# Altium integrated library MOTHER_BOARD_LS1021_v1.0.IntLib: 147 symbols
Pins are listed as number, name and electrical type; pins without a type are passive.

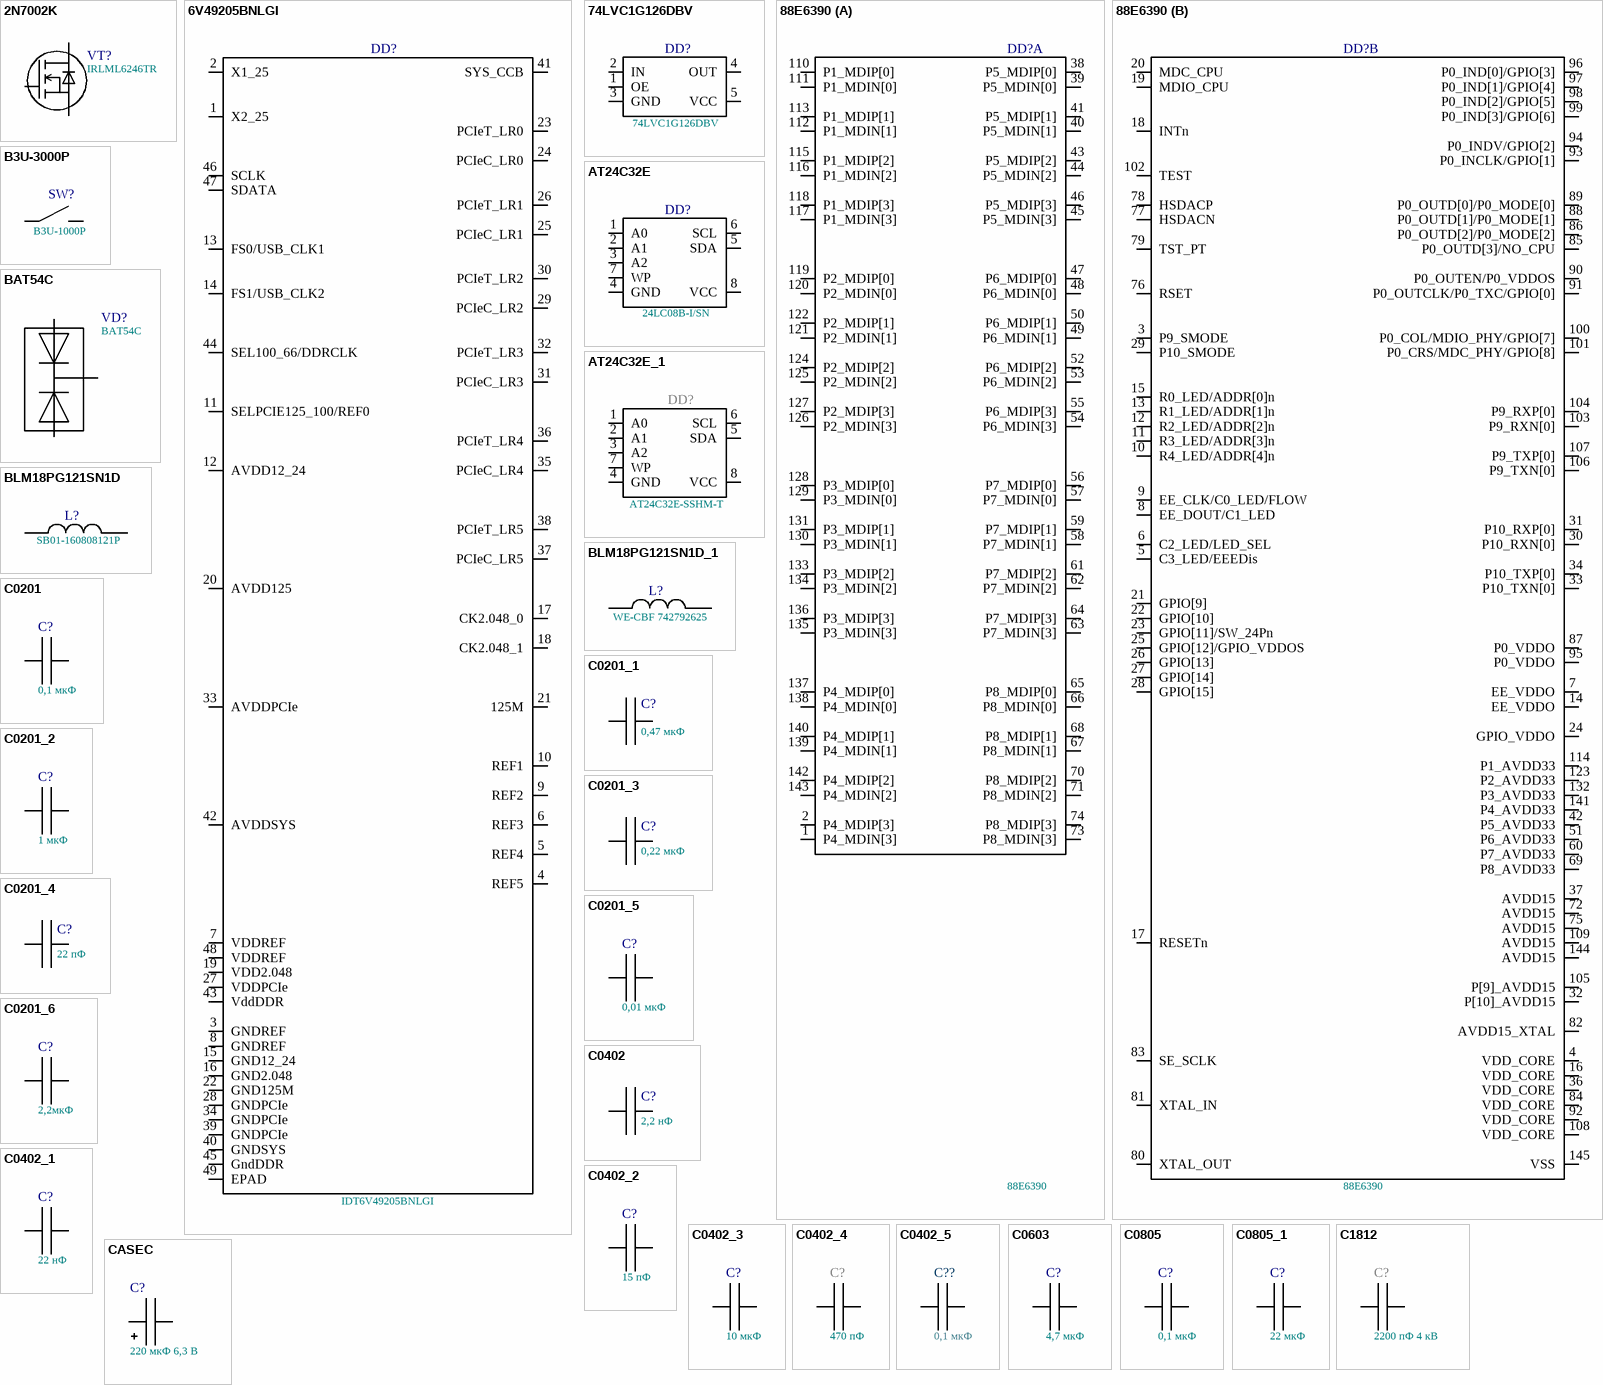
[diagram p0: symbols 2N7002K to CASEC]

## 2N7002K
designator VT?, comment IRLML6246TR
Транзистор MOSFET N-Channel IRLML6246TR SOT-23; VALUE: IRLML6246TRPbF
footprint SOT-23
pins: 1 G, 2 S, 3 D

## 6V49205BNLGI
designator DD?, comment IDT6V49205BNLGI
Микросхема IDT6V49205BNLGI; Manufactory: IDT; Function: Генератор частот для QorIQ® Layerscape Processors
footprint QFN48_7x7
pins: 1 X2_25, 2 X1_25, 3 GNDREF, 4 REF5, 5 REF4, 6 REF3, 7 VDDREF, 8 GNDREF, 9 REF2, 10 REF1, 11 SELPCIE125_100/REF0, 12 AVDD12_24, 13 FS0/USB_CLK1, 14 FS1/USB_CLK2, 15 GND12_24, 16 GND2.048, 17 CK2.048_0, 18 CK2.048_1, 19 VDD2.048, 20 AVDD125, 21 125M, 22 GND125M, 23 PCIeT_LR0, 24 PCIeC_LR0, 25 PCIeC_LR1, 26 PCIeT_LR1, 27 VDDPCIe, 28 GNDPCIe, 29 PCIeC_LR2, 30 PCIeT_LR2, 31 PCIeC_LR3, 32 PCIeT_LR3, 33 AVDDPCIe, 34 GNDPCIe, 35 PCIeC_LR4, 36 PCIeT_LR4, 37 PCIeC_LR5, 38 PCIeT_LR5, 39 GNDPCIe, 40 GNDSYS, 41 SYS_CCB, 42 AVDDSYS, 43 VddDDR, 44 SEL100_66/DDRCLK, 45 GndDDR, 46 SCLK, 47 SDATA, 48 VDDREF, 49 EPAD

## 74LVC1G126DBV
designator DD?
Микросхема 74LVC1G126DBV; Manufactory: Texas Instruments; Function: Single non-inverting buffer/bus driver with a 3-state output
footprint SOT-23(DBV5)
pins: 1 OE, 2 IN, 3 GND (power), 4 OUT, 5 VCC (power)

## 88E6390
designator DD?
Микросхема 88E6390-xxTLA2I000; Manufactory: Marvell Technology; Function: 11-Port AVB GE Switch, 8 GE PHYs + 1 RGMII/MII/RMII + 2 2.5G Serdes/SGMII
footprint TQFP-144 (EPAD)
part A pins: 1 P4_MDIN[3], 2 P4_MDIP[3], 38 P5_MDIP[0], 39 P5_MDIN[0], 40 P5_MDIN[1], 41 P5_MDIP[1], 43 P5_MDIP[2], 44 P5_MDIN[2], 45 P5_MDIN[3], 46 P5_MDIP[3], 47 P6_MDIP[0], 48 P6_MDIN[0], 49 P6_MDIN[1], 50 P6_MDIP[1], 52 P6_MDIP[2], 53 P6_MDIN[2], 54 P6_MDIN[3], 55 P6_MDIP[3], 56 P7_MDIP[0], 57 P7_MDIN[0], 58 P7_MDIN[1], 59 P7_MDIP[1], 61 P7_MDIP[2], 62 P7_MDIN[2], 63 P7_MDIN[3], 64 P7_MDIP[3], 65 P8_MDIP[0], 66 P8_MDIN[0], 67 P8_MDIN[1], 68 P8_MDIP[1], 70 P8_MDIP[2], 71 P8_MDIN[2], 73 P8_MDIN[3], 74 P8_MDIP[3], 110 P1_MDIP[0], 111 P1_MDIN[0], 112 P1_MDIN[1], 113 P1_MDIP[1], 115 P1_MDIP[2], 116 P1_MDIN[2], 117 P1_MDIN[3], 118 P1_MDIP[3], 119 P2_MDIP[0], 120 P2_MDIN[0], 121 P2_MDIN[1], 122 P2_MDIP[1], 124 P2_MDIP[2], 125 P2_MDIN[2], 126 P2_MDIN[3], 127 P2_MDIP[3], 128 P3_MDIP[0], 129 P3_MDIN[0], 130 P3_MDIN[1], 131 P3_MDIP[1], 133 P3_MDIP[2], 134 P3_MDIN[2], 135 P3_MDIN[3], 136 P3_MDIP[3], 137 P4_MDIP[0], 138 P4_MDIN[0], 139 P4_MDIN[1], 140 P4_MDIP[1], 142 P4_MDIP[2], 143 P4_MDIN[2]
part B pins: 3 P9_SMODE, 4 VDD_CORE, 5 C3_LED/EEEDis, 6 C2_LED/LED_SEL, 7 EE_VDDO, 8 EE_DOUT/C1_LED, 9 EE_CLK/C0_LED/FLOW, 10 R4_LED/ADDR[4]n, 11 R3_LED/ADDR[3]n, 12 R2_LED/ADDR[2]n, 13 R1_LED/ADDR[1]n, 14 EE_VDDO, 15 R0_LED/ADDR[0]n, 16 VDD_CORE, 17 RESETn, 18 INTn, 19 MDIO_CPU, 20 MDC_CPU, 21 GPIO[9], 22 GPIO[10], 23 GPIO[11]/SW_24Pn, 24 GPIO_VDDO, 25 GPIO[12]/GPIO_VDDOS, 26 GPIO[13], 27 GPIO[14], 28 GPIO[15], 29 P10_SMODE, 30 P10_RXN[0], 31 P10_RXP[0], 32 P[10]_AVDD15, 33 P10_TXN[0], 34 P10_TXP[0], 36 VDD_CORE, 37 AVDD15, 42 P5_AVDD33, 51 P6_AVDD33, 60 P7_AVDD33, 69 P8_AVDD33, 72 AVDD15, 75 AVDD15, 76 RSET, 77 HSDACN, 78 HSDACP, 79 TST_PT, 80 XTAL_OUT, 81 XTAL_IN, 82 AVDD15_XTAL, 83 SE_SCLK, 84 VDD_CORE, 85 P0_OUTD[3]/NO_CPU, 86 P0_OUTD[2]/P0_MODE[2], 87 P0_VDDO, 88 P0_OUTD[1]/P0_MODE[1], 89 P0_OUTD[0]/P0_MODE[0], 90 P0_OUTEN/P0_VDDOS, 91 P0_OUTCLK/P0_TXC/GPIO[0], 92 VDD_CORE, 93 P0_INCLK/GPIO[1], 94 P0_INDV/GPIO[2], 95 P0_VDDO, 96 P0_IND[0]/GPIO[3], 97 P0_IND[1]/GPIO[4], 98 P0_IND[2]/GPIO[5], 99 P0_IND[3]/GPIO[6], 100 P0_COL/MDIO_PHY/GPIO[7], 101 P0_CRS/MDC_PHY/GPIO[8], 102 TEST, 103 P9_RXN[0], 104 P9_RXP[0], 105 P[9]_AVDD15, 106 P9_TXN[0], 107 P9_TXP[0], 108 VDD_CORE, 109 AVDD15, 114 P1_AVDD33, 123 P2_AVDD33, 132 P3_AVDD33, 141 P4_AVDD33, 144 AVDD15, 145 VSS

## AT24C32E
designator DD?, comment 24LC08B-I/SN
Микросхема 24LC08B-I/SN; Manufactory: Microchip Technology; Function: 8K I2C™ Serial EEPROM
footprint SOIC8
pins: 1 A0, 2 A1, 3 A2, 4 GND, 5 SDA, 6 SCL, 7 WP, 8 VCC

## AT24C32E_1
designator DD?, comment AT24C32E-SSHM-T  (no BOM)
Микросхема AT24C32E-SSHM-T; Manufactory: Microchip Technology; Function: Память EEPROM I2C 32 Кбит
footprint SOIC8
pins: 1 A0, 2 A1, 3 A2, 4 GND, 5 SDA, 6 SCL, 7 WP, 8 VCC

## B3U-3000P
designator SW?, comment B3U-1000P
Кнопка тактовая B3U-1000P; Manufactory: Omron
pins: 1, 2

## BAT54C
designator VD?
Диодная сборка с общим катодом BAT54C SOT-23
footprint SOT-23
pins: 1, 2, 3

## BLM18PG121SN1D
designator L?, comment SB01-160808121P
Индуктивность SB01-160808121P; Manufactory: CHIKARA Electronics; Function: 120 Ohms @ 100MHz 1 Power Line Ferrite Bead 0603 (1608 Metric) 2,2 A
footprint L0603 (Ferrite bead)
pins: 1, 2

## BLM18PG121SN1D_1
designator L?, comment WE-CBF 742792625
Фильтр индуктивный WE-CBF 742792625 Wurth Elektronik; TYPE: BLM18PG121SN1D
footprint L0603 (Ferrite bead)
pins: 1, 2

## C0201
designator C?, comment 0,1 мкФ
Чип-конденсатор 0,1 мкФ 10 В 0201; TYPE: Чип-конденсатор 0201
footprint C0201
footprint C0201
pins: 1, 2

## C0201_1
designator C?, comment 0,47 мкФ
Чип-конденсатор 0,47 мкФ 10 В 0201; TYPE: Чип-конденсатор 0201
footprint C0201
pins: 1, 2

## C0201_2
designator C?, comment 1 мкФ
Чип-конденсатор 1 мкФ 10 В 0201; TYPE: Чип-конденсатор 0201
footprint C0201
pins: 1, 2

## C0201_3
designator C?, comment 0,22 мкФ
Чип-конденсатор 0,22 мкФ 6,3 В 0201; TYPE: Чип-конденсатор 0201
footprint C0201
pins: 1, 2

## C0201_4
designator C?, comment 22 пФ
Чип-конденсатор 22 пФ 25 В 0201; TYPE: Чип-конденсатор 0201
footprint C0201
pins: 1, 2

## C0201_5
designator C?, comment 0,01 мкФ
Чип-конденсатор 0,01 мкФ 10 В 0201; TYPE: Чип-конденсатор 0201
footprint C0201
pins: 1, 2

## C0201_6
designator C?, comment 2,2мкФ
Чип-конденсатор 2,2 мкФ 10 В 0201; TYPE: Чип-конденсатор 0201
footprint C0201
pins: 1, 2

## C0402
designator C?, comment 2,2 нФ
Чип-конденсатор 2200 пФ 50 В 0402; TYPE: Чип-конденсатор 0402
footprint C0402
pins: 1, 2

## C0402_1
designator C?, comment 22 нФ
Чип-конденсатор 22 нФ 50 В 0402; TYPE: Чип-конденсатор 0402
footprint C0402
pins: 1, 2

## C0402_2
designator C?, comment 15 пФ
Чип-конденсатор 15 пФ 50 В 0402; TYPE: Чип-конденсатор 0402
footprint C0402
pins: 1, 2

## C0402_3
designator C?, comment 10 мкФ
Чип-конденсатор 10 мкФ 6,3 В 0402; TYPE: Чип-конденсатор 0402
footprint C0402
pins: 1, 2

## C0402_4
designator C?, comment 470 пФ  (no BOM)
Чип-конденсатор 470 пФ ±20% 0402; TYPE: Чип-конденсатор 0402; VALUE: 470 пФ 0402
footprint C0402
pins: 1, 2

## C0402_5
designator C??, comment 0,1 мкФ
Чип-конденсатор 0,1 мкФ 16В/25В 0402; TYPE: Чип-конденсатор 0402
footprint C0402
pins: 1, 2

## C0603
designator C?, comment 4,7 мкФ
Чип-конденсатор 4,7 мкФ 10 В 0603; TYPE: Чип-конденсатор 0603
footprint C0603
pins: 1, 2

## C0805
designator C?, comment 0,1 мкФ
Чип-конденсатор 0,1 мкФ  100 В 0805; TYPE: Чип-конденсатор 0805
footprint C0805
pins: 1, 2

## C0805_1
designator C?, comment 22 мкФ
Чип-конденсатор 22 мкФ 25 В 0805; TYPE: Чип-конденсатор 0805
footprint C0805
pins: 1, 2

## C1812
designator C?, comment 2200 пФ 4 кВ  (no BOM)
Чип-конденсатор 2200 пФ 4 кВ 1812; TYPE: Чип-конденсатор 0402
footprint C1812
pins: 1, 2

## CASEC
designator C?, comment 220 мкФ 6,3 В
Конденсатор танталовый  220 мкФ ±20% 6,3 В Case C
footprint CaseC
pins: 1, 2

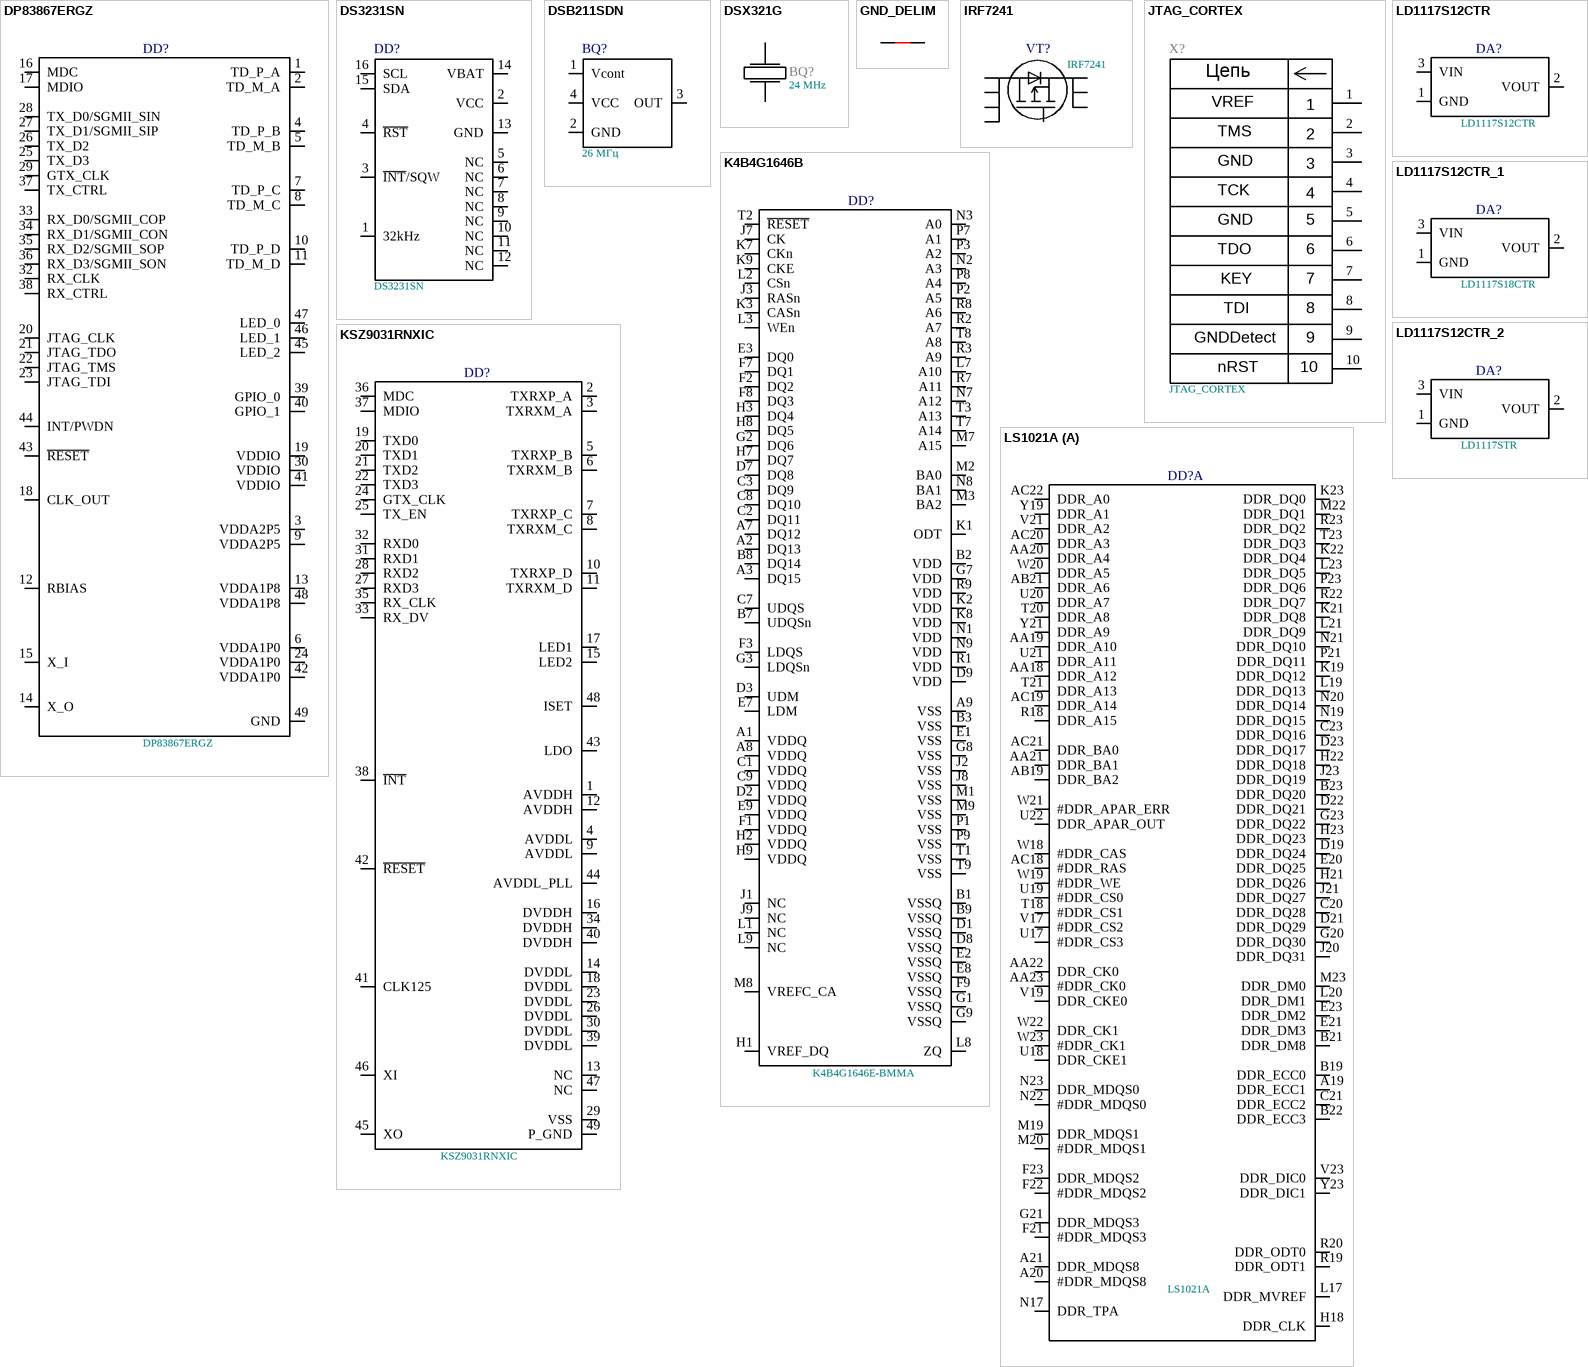
[diagram p1: symbols DP83867ERGZ to LS1021A]

## DP83867ERGZ
designator DD?
Микросхема DP83867ERGZ; Manufactory: Texas Instruments; Function: 10/100/1000 Ethernet Physical  Layer Transceiver
footprint QFN-48
pins: 1 TD_P_A, 2 TD_M_A, 3 VDDA2P5, 4 TD_P_B, 5 TD_M_B, 6 VDDA1P0, 7 TD_P_C, 8 TD_M_C, 9 VDDA2P5, 10 TD_P_D, 11 TD_M_D, 12 RBIAS, 13 VDDA1P8, 14 X_O, 15 X_I, 16 MDC, 17 MDIO, 18 CLK_OUT, 19 VDDIO, 20 JTAG_CLK, 21 JTAG_TDO, 22 JTAG_TMS, 23 JTAG_TDI, 24 VDDA1P0, 25 TX_D3, 26 TX_D2, 27 TX_D1/SGMII_SIP, 28 TX_D0/SGMII_SIN, 29 GTX_CLK, 30 VDDIO, 32 RX_CLK, 33 RX_D0/SGMII_COP, 34 RX_D1/SGMII_CON, 35 RX_D2/SGMII_SOP, 36 RX_D3/SGMII_SON, 37 TX_CTRL, 38 RX_CTRL, 39 GPIO_0, 40 GPIO_1, 41 VDDIO, 42 VDDA1P0, 43 ~{RESET}, 44 INT/PWDN, 45 LED_2, 46 LED_1, 47 LED_0, 48 VDDA1P8, 49 GND

## DS3231SN
designator DD?
Микросхема DS3231SN; Manufactory: Maxim Integrated; Function: Extremely Accurate I2C-Integrated RTC/TCXO/Crystal
footprint SOIC-16(WIDE) 0.6х2 P1.27
pins: 1 32kHz, 2 VCC, 3 ~{INT}/SQW, 4 ~{RST}, 5 NC, 6 NC, 7 NC, 8 NC, 9 NC, 10 NC, 11 NC, 12 NC, 13 GND, 14 VBAT, 15 SDA, 16 SCL

## DSB211SDN
designator BQ?, comment 26 МГц
Генератор кварцевый DSB211SDN 26 МГц +3,3 В
footprint DSB211SDN
pins: 1 Vcont, 2 GND, 3 OUT, 4 VCC

## DSX321G
designator BQ?, comment 24 MHz  (no BOM)
Резонатор кварцевый DSX321G 24 MHz
footprint DS321G
footprint DS321G
pins: 1, 3

## GND_DELIM
designator K?  (value not drawn)  (net tie, no BOM)
Точка соединения земель
footprint GND_DELIM
pins: 1, 2

## IRF7241
designator VT?
Транзистор MOSFET P-Channel IRF7241 SOIC-8
footprint SOIC8
pins: 1 S, 2 S, 3 S, 4 G, 5 D, 6 D, 7 D, 8 D

## JTAG_CORTEX
designator X?  (no BOM)
PLLD1.27-10s
footprint PLLD1.27-10s
pins: 1, 2, 3, 4, 5, 6, 7, 8, 9, 10
text: Цепь; VREF; TMS; GND; TCK; TDO; KEY; TDI; GNDDetect; nRST

## K4B4G1646B
designator DD?, comment K4B4G1646E-BMMA
Микросхема K4B4G1646E-BMMA; Manufactory: Samsung Semiconductor; Function: Память DDR3L SDRAM 4Gb (256x16)
footprint FBGA-96
pins: A1 VDDQ, A2 DQ13, A3 DQ15, A7 DQ12, A8 VDDQ, A9 VSS, B1 VSSQ, B2 VDD, B3 VSS, B7 UDQSn, B8 DQ14, B9 VSSQ, C1 VDDQ, C2 DQ11, C3 DQ9, C7 UDQS, C8 DQ10, C9 VDDQ, D1 VSSQ, D2 VDDQ, D3 UDM, D7 DQ8, D8 VSSQ, D9 VDD, E1 VSS, E2 VSSQ, E3 DQ0, E7 LDM, E8 VSSQ, E9 VDDQ, F1 VDDQ, F2 DQ2, F3 LDQS, F7 DQ1, F8 DQ3, F9 VSSQ, G1 VSSQ, G2 DQ6, G3 LDQSn, G7 VDD, G8 VSS, G9 VSSQ, H1 VREF_DQ, H2 VDDQ, H3 DQ4, H7 DQ7, H8 DQ5, H9 VDDQ, J1 NC, J2 VSS, J3 RASn, J7 CK, J8 VSS, J9 NC, K1 ODT, K2 VDD, K3 CASn, K7 CKn, K8 VDD, K9 CKE, L1 NC, L2 CSn, L3 WEn, L7 A10, L8 ZQ, L9 NC, M1 VSS, M2 BA0, M3 BA2, M7 A15, M8 VREFC_CA, M9 VSS, N1 VDD, N2 A3, N3 A0, N7 A12, N8 BA1, N9 VDD, P1 VSS, P2 A5, P3 A2, P7 A1, P8 A4, P9 VSS, R1 VDD, R2 A7, R3 A9, R7 A11, R8 A6, R9 VDD, T1 VSS, T2 ~{RESET}, T3 A13, T7 A14, T8 A8, T9 VSS

## KSZ9031RNXIC
designator DD?
Микросхема KSZ9031RNXIC; Manufactory: Microchip Technology; Function: Gigabit Ethernet Transceiver with GMII/MII Support with Low Power Features
footprint QFN48 (5.1 Epad) (KSZ9031RNXCC)
pins: 1 AVDDH, 2 TXRXP_A, 3 TXRXM_A, 4 AVDDL, 5 TXRXP_B, 6 TXRXM_B, 7 TXRXP_C, 8 TXRXM_C, 9 AVDDL, 10 TXRXP_D, 11 TXRXM_D, 12 AVDDH, 13 NC, 14 DVDDL, 15 LED2, 16 DVDDH, 17 LED1, 18 DVDDL, 19 TXD0, 20 TXD1, 21 TXD2, 22 TXD3, 23 DVDDL, 24 GTX_CLK, 25 TX_EN, 26 DVDDL, 27 RXD3, 28 RXD2, 29 VSS, 30 DVDDL, 31 RXD1, 32 RXD0, 33 RX_DV, 34 DVDDH, 35 RX_CLK, 36 MDC, 37 MDIO, 38 ~{INT}, 39 DVDDL, 40 DVDDH, 41 CLK125, 42 ~{RESET}, 43 LDO, 44 AVDDL_PLL, 45 XO, 46 XI, 47 NC, 48 ISET, 49 P_GND

## LD1117S12CTR
designator DA?
Микросхема LD1117S12CTR; Manufactory: STMicroelectronics; Function: Low Drop Fixed +1,2V Voltage Regulator
footprint SOT-223
pins: 1 GND, 2 VOUT, 3 VIN

## LD1117S12CTR_1
designator DA?, comment LD1117S18CTR
Микросхема LD1117S18CTR; Manufactory: STMicroelectronics; Function: Low Drop Fixed +1,8V Voltage Regulator
footprint SOT-223
pins: 1 GND, 2 VOUT, 3 VIN

## LD1117S12CTR_2
designator DA?, comment LD1117STR
Микросхема LD1117STR; Manufactory: STMicroelectronics; Function: Low Drop adjustable voltage regulator
footprint SOT-223
pins: 1 GND, 2 VOUT, 3 VIN

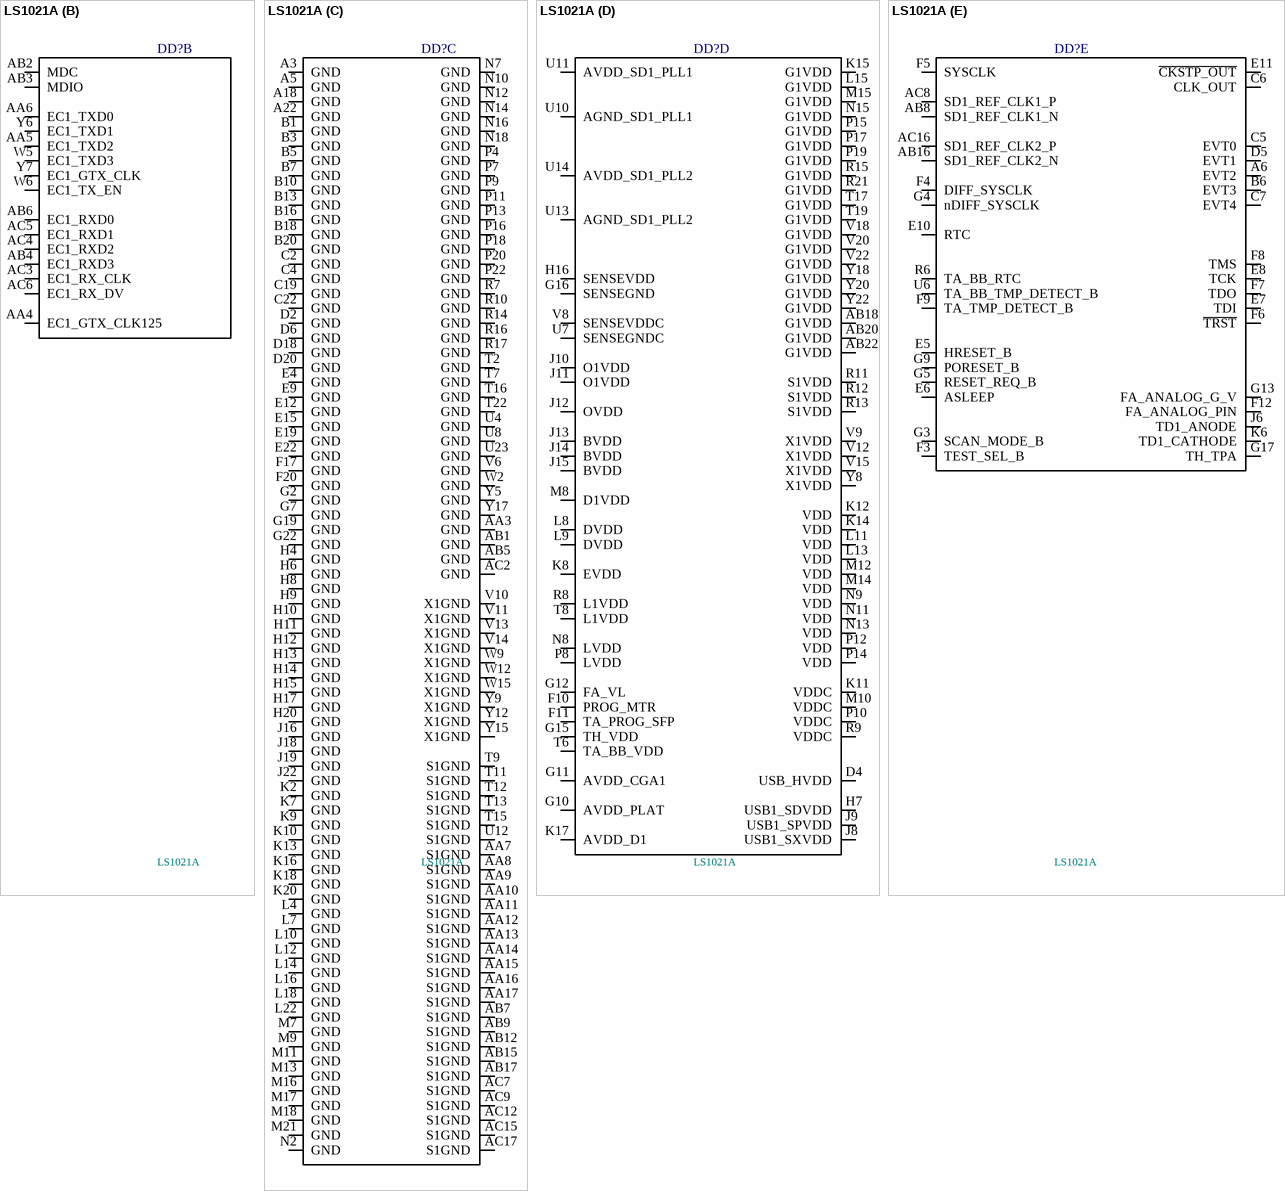
[diagram p2: symbol LS1021A]

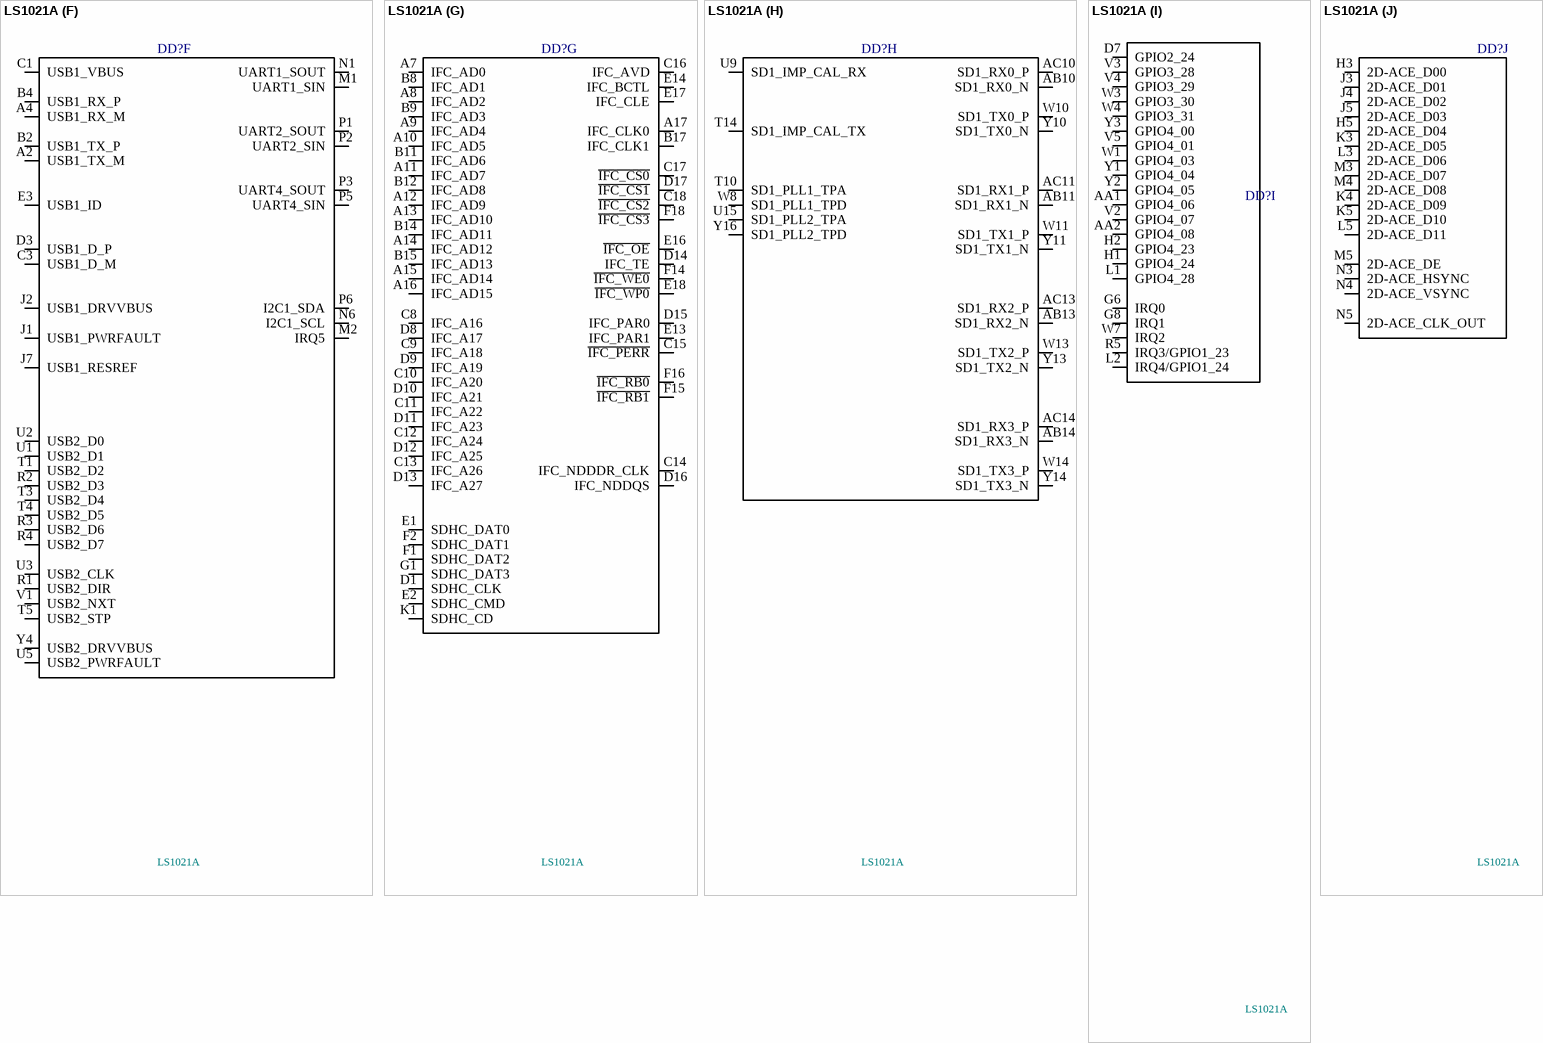
[diagram p3: symbol LS1021A]

## LS1021A
designator DD?
Микросхема LS1021AXN7MQB; Manufactory: NXP Semiconductor; Function: QorIQ® Layerscape 1021A Dual-Core Communications Processor with LCD Controller
footprint BGA525
part A pins: A19 DDR_ECC1, A20 #DDR_MDQS8, A21 DDR_MDQS8, AA18 DDR_A12, AA19 DDR_A10, AA20 DDR_A4, AA21 DDR_BA1, AA22 DDR_CK0, AA23 #DDR_CK0, AB19 DDR_BA2, AB21 DDR_A6, AC18 #DDR_RAS, AC19 DDR_A14, AC20 DDR_A3, AC21 DDR_BA0, AC22 DDR_A0, B19 DDR_ECC0, B21 DDR_DM8, B22 DDR_ECC3, B23 DDR_DQ20, C20 DDR_DQ28, C21 DDR_ECC2, C23 DDR_DQ16, D19 DDR_DQ24, D21 DDR_DQ29, D22 DDR_DQ21, D23 DDR_DQ17, E20 DDR_DQ25, E21 DDR_DM3, E23 DDR_DM2, F21 #DDR_MDQS3, F22 #DDR_MDQS2, F23 DDR_MDQS2, G20 DDR_DQ30, G21 DDR_MDQS3, G23 DDR_DQ22, H18 DDR_CLK, H21 DDR_DQ26, H22 DDR_DQ18, H23 DDR_DQ23, J20 DDR_DQ31, J21 DDR_DQ27, J23 DDR_DQ19, K19 DDR_DQ12, K21 DDR_DQ8, K22 DDR_DQ4, K23 DDR_DQ0, L17 DDR_MVREF, L19 DDR_DQ13, L20 DDR_DM1, L21 DDR_DQ9, L23 DDR_DQ5, M19 DDR_MDQS1, M20 #DDR_MDQS1, M22 DDR_DQ1, M23 DDR_DM0, N17 DDR_TPA, N19 DDR_DQ15, N20 DDR_DQ14, N21 DDR_DQ10, N22 #DDR_MDQS0, N23 DDR_MDQS0, P21 DDR_DQ11, P23 DDR_DQ6, R18 DDR_A15, R19 DDR_ODT1, R20 DDR_ODT0, R22 DDR_DQ7, R23 DDR_DQ2, T18 #DDR_CS1, T20 DDR_A8, T21 DDR_A13, T23 DDR_DQ3, U17 #DDR_CS3, U18 DDR_CKE1, U19 #DDR_CS0, U20 DDR_A7, U21 DDR_A11, U22 DDR_APAR_OUT, V17 #DDR_CS2, V19 DDR_CKE0, V21 DDR_A2, V23 DDR_DIC0, W18 #DDR_CAS, W19 #DDR_WE, W20 DDR_A5, W21 #DDR_APAR_ERR, W22 DDR_CK1, W23 #DDR_CK1, Y19 DDR_A1, Y21 DDR_A9, Y23 DDR_DIC1
part B pins: AA4 EC1_GTX_CLK125, AA5 EC1_TXD2, AA6 EC1_TXD0, AB2 MDC, AB3 MDIO, AB4 EC1_RXD3, AB6 EC1_RXD0, AC3 EC1_RX_CLK, AC4 EC1_RXD2, AC5 EC1_RXD1, AC6 EC1_RX_DV, W5 EC1_TXD3, W6 EC1_TX_EN, Y6 EC1_TXD1, Y7 EC1_GTX_CLK
part C pins: A3 GND, A5 GND, A18 GND, A22 GND, AA3 GND, AA7 S1GND, AA8 S1GND, AA9 S1GND, AA10 S1GND, AA11 S1GND, AA12 S1GND, AA13 S1GND, AA14 S1GND, AA15 S1GND, AA16 S1GND, AA17 S1GND, AB1 GND, AB5 GND, AB7 S1GND, AB9 S1GND, AB12 S1GND, AB15 S1GND, AB17 S1GND, AC2 GND, AC7 S1GND, AC9 S1GND, AC12 S1GND, AC15 S1GND, AC17 S1GND, B1 GND, B3 GND, B5 GND, B7 GND, B10 GND, B13 GND, B16 GND, B18 GND, B20 GND, C2 GND, C4 GND, C19 GND, C22 GND, D2 GND, D6 GND, D18 GND, D20 GND, E4 GND, E9 GND, E12 GND, E15 GND, E19 GND, E22 GND, F17 GND, F20 GND, G2 GND, G7 GND, G19 GND, G22 GND, H4 GND, H6 GND, H8 GND, H9 GND, H10 GND, H11 GND, H12 GND, H13 GND, H14 GND, H15 GND, H17 GND, H20 GND, J16 GND, J18 GND, J19 GND, J22 GND, K2 GND, K7 GND, K9 GND, K10 GND, K13 GND, K16 GND, K18 GND, K20 GND, L4 GND, L7 GND, L10 GND, L12 GND, L14 GND, L16 GND, L18 GND, L22 GND, M7 GND, M9 GND, M11 GND, M13 GND, M16 GND, M17 GND, M18 GND, M21 GND, N2 GND, N7 GND, N10 GND, N12 GND, N14 GND, N16 GND, N18 GND, P4 GND, P7 GND, P9 GND, P11 GND, P13 GND, P16 GND, P18 GND, P20 GND, P22 GND, R7 GND, R10 GND, R14 GND, R16 GND, R17 GND, T2 GND, T7 GND, T9 S1GND, T11 S1GND, T12 S1GND, T13 S1GND, T15 S1GND, T16 GND, T22 GND, U4 GND, U8 GND, U12 S1GND, U23 GND, V6 GND, V10 X1GND, V11 X1GND, V13 X1GND, V14 X1GND, W2 GND, W9 X1GND, W12 X1GND, W15 X1GND, Y5 GND, Y9 X1GND, Y12 X1GND, Y15 X1GND, Y17 GND
part D pins: AB18 G1VDD, AB20 G1VDD, AB22 G1VDD, D4 USB_HVDD, F10 PROG_MTR, F11 TA_PROG_SFP, G10 AVDD_PLAT, G11 AVDD_CGA1, G12 FA_VL, G15 TH_VDD, G16 SENSEGND, H7 USB1_SDVDD, H16 SENSEVDD, J8 USB1_SXVDD, J9 USB1_SPVDD, J10 O1VDD, J11 O1VDD, J12 OVDD, J13 BVDD, J14 BVDD, J15 BVDD, K8 EVDD, K11 VDDC, K12 VDD, K14 VDD, K15 G1VDD, K17 AVDD_D1, L8 DVDD, L9 DVDD, L11 VDD, L13 VDD, L15 G1VDD, M8 D1VDD, M10 VDDC, M12 VDD, M14 VDD, M15 G1VDD, N8 LVDD, N9 VDD, N11 VDD, N13 VDD, N15 G1VDD, P8 LVDD, P10 VDDC, P12 VDD, P14 VDD, P15 G1VDD, P17 G1VDD, P19 G1VDD, R8 L1VDD, R9 VDDC, R11 S1VDD, R12 S1VDD, R13 S1VDD, R15 G1VDD, R21 G1VDD, T6 TA_BB_VDD, T8 L1VDD, T17 G1VDD, T19 G1VDD, U7 SENSEGNDC, U10 AGND_SD1_PLL1, U11 AVDD_SD1_PLL1, U13 AGND_SD1_PLL2, U14 AVDD_SD1_PLL2, V8 SENSEVDDC, V9 X1VDD, V12 X1VDD, V15 X1VDD, V18 G1VDD, V20 G1VDD, V22 G1VDD, Y8 X1VDD, Y18 G1VDD, Y20 G1VDD, Y22 G1VDD
part E pins: A6 EVT2, AB8 SD1_REF_CLK1_N, AB16 SD1_REF_CLK2_N, AC8 SD1_REF_CLK1_P, AC16 SD1_REF_CLK2_P, B6 EVT3, C5 EVT0, C6 CLK_OUT, C7 EVT4, D5 EVT1, E5 HRESET_B, E6 ASLEEP, E7 TDI, E8 TCK, E10 RTC, E11 ~{CKSTP_OUT}, F3 TEST_SEL_B, F4 DIFF_SYSCLK, F5 SYSCLK, F6 ~{TRST}, F7 TDO, F8 TMS, F9 TA_TMP_DETECT_B, F12 FA_ANALOG_PIN, G3 SCAN_MODE_B, G4 nDIFF_SYSCLK, G5 RESET_REQ_B, G9 PORESET_B, G13 FA_ANALOG_G_V, G17 TH_TPA, J6 TD1_ANODE, K6 TD1_CATHODE, R6 TA_BB_RTC, U6 TA_BB_TMP_DETECT_B
part F pins: A2 USB1_TX_M, A4 USB1_RX_M, B2 USB1_TX_P, B4 USB1_RX_P, C1 USB1_VBUS, C3 USB1_D_M, D3 USB1_D_P, E3 USB1_ID, J1 USB1_PWRFAULT, J2 USB1_DRVVBUS, J7 USB1_RESREF, M1 UART1_SIN, M2 IRQ5, N1 UART1_SOUT, N6 I2C1_SCL, P1 UART2_SOUT, P2 UART2_SIN, P3 UART4_SOUT, P5 UART4_SIN, P6 I2C1_SDA, R1 USB2_DIR, R2 USB2_D3, R3 USB2_D6, R4 USB2_D7, T1 USB2_D2, T3 USB2_D4, T4 USB2_D5, T5 USB2_STP, U1 USB2_D1, U2 USB2_D0, U3 USB2_CLK, U5 USB2_PWRFAULT, V1 USB2_NXT, Y4 USB2_DRVVBUS
part G pins: A7 IFC_AD0, A8 IFC_AD2, A9 IFC_AD4, A10 IFC_AD5, A11 IFC_AD7, A12 IFC_AD9, A13 IFC_AD10, A14 IFC_AD12, A15 IFC_AD14, A16 IFC_AD15, A17 IFC_CLK0, B8 IFC_AD1, B9 IFC_AD3, B11 IFC_AD6, B12 IFC_AD8, B14 IFC_AD11, B15 IFC_AD13, B17 IFC_CLK1, C8 IFC_A16, C9 IFC_A18, C10 IFC_A20, C11 IFC_A22, C12 IFC_A24, C13 IFC_A26, C14 IFC_NDDDR_CLK, C15 ~{IFC_PERR}, C16 IFC_AVD, C17 ~{IFC_CS0}, C18 ~{IFC_CS2}, D1 SDHC_CLK, D8 IFC_A17, D9 IFC_A19, D10 IFC_A21, D11 IFC_A23, D12 IFC_A25, D13 IFC_A27, D14 IFC_TE, D15 IFC_PAR0, D16 IFC_NDDQS, D17 ~{IFC_CS1}, E1 SDHC_DAT0, E2 SDHC_CMD, E13 IFC_PAR1, E14 IFC_BCTL, E16 ~{IFC_OE}, E17 IFC_CLE, E18 ~{IFC_WP0}, F1 SDHC_DAT2, F2 SDHC_DAT1, F14 ~{IFC_WE0}, F15 ~{IFC_RB1}, F16 ~{IFC_RB0}, F18 ~{IFC_CS3}, G1 SDHC_DAT3, K1 SDHC_CD
part H pins: AB10 SD1_RX0_N, AB11 SD1_RX1_N, AB13 SD1_RX2_N, AB14 SD1_RX3_N, AC10 SD1_RX0_P, AC11 SD1_RX1_P, AC13 SD1_RX2_P, AC14 SD1_RX3_P, T10 SD1_PLL1_TPA, T14 SD1_IMP_CAL_TX, U9 SD1_IMP_CAL_RX, U15 SD1_PLL2_TPA, W8 SD1_PLL1_TPD, W10 SD1_TX0_P, W11 SD1_TX1_P, W13 SD1_TX2_P, W14 SD1_TX3_P, Y10 SD1_TX0_N, Y11 SD1_TX1_N, Y13 SD1_TX2_N, Y14 SD1_TX3_N, Y16 SD1_PLL2_TPD
part I pins: AA1 GPIO4_06, AA2 GPIO4_08, D7 GPIO2_24, G6 IRQ0, G8 IRQ1, H1 GPIO4_24, H2 GPIO4_23, L1 GPIO4_28, L2 IRQ4/GPIO1_24, R5 IRQ3/GPIO1_23, V2 GPIO4_07, V3 GPIO3_28, V4 GPIO3_29, V5 GPIO4_01, W1 GPIO4_03, W3 GPIO3_30, W4 GPIO3_31, W7 IRQ2, Y1 GPIO4_04, Y2 GPIO4_05, Y3 GPIO4_00
part J pins: H3 2D-ACE_D00, H5 2D-ACE_D04, J3 2D-ACE_D01, J4 2D-ACE_D02, J5 2D-ACE_D03, K3 2D-ACE_D05, K4 2D-ACE_D09, K5 2D-ACE_D10, L3 2D-ACE_D06, L5 2D-ACE_D11, M3 2D-ACE_D07, M4 2D-ACE_D08, M5 2D-ACE_DE, N3 2D-ACE_HSYNC, N4 2D-ACE_VSYNC, N5 2D-ACE_CLK_OUT

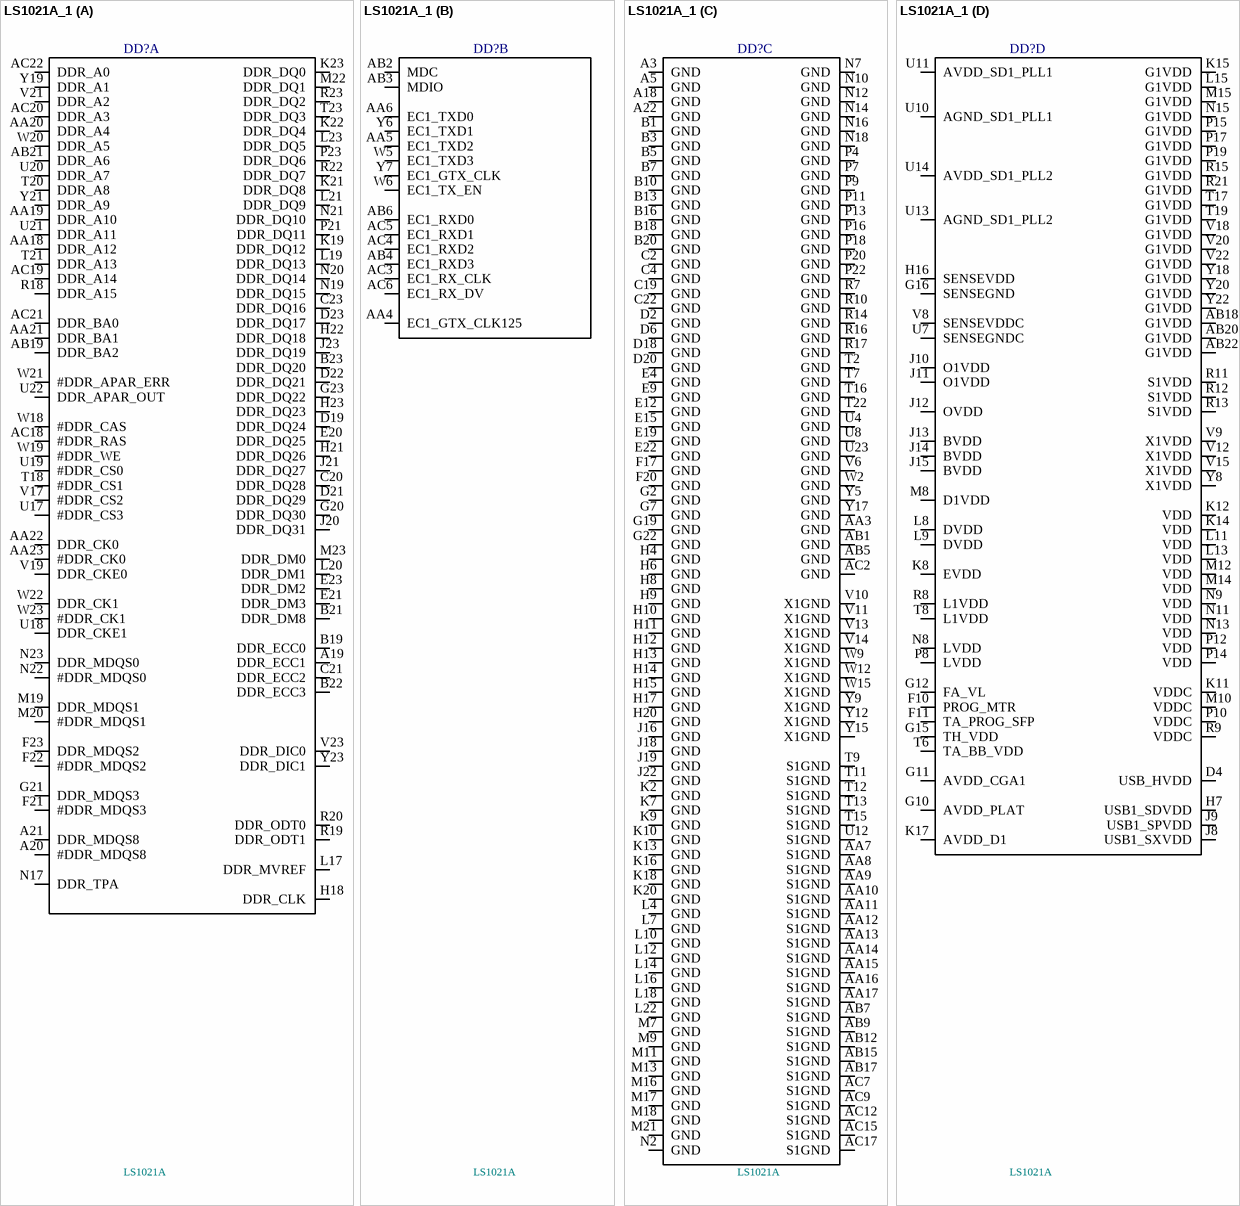
[diagram p4: symbol LS1021A_1]

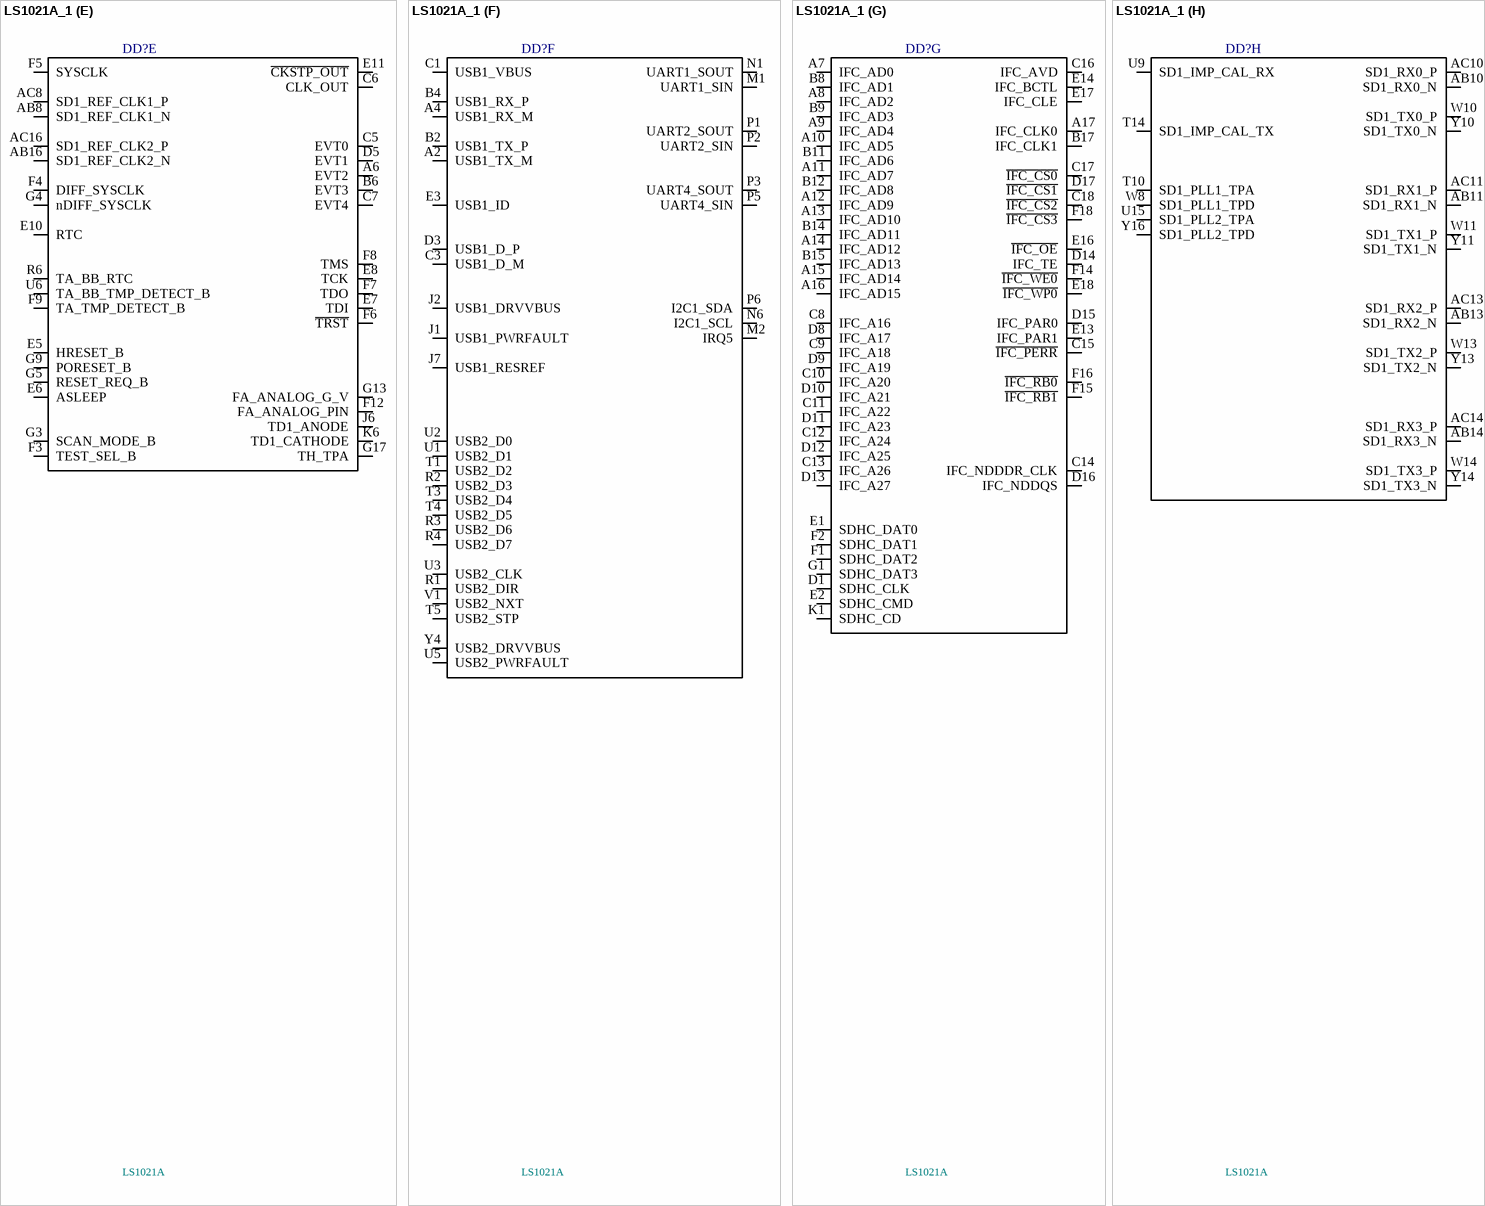
[diagram p5: symbol LS1021A_1]
